# Altium footprint library Standard2.PcbLib: 423 footprints (part 9 of 27)
Each footprint in its own frame and in the unit in brackets; x right, y up, seen from the top. Pads: shape width x height; smd on the part's side, far side on the other; paste and mask are expansions set on the pad; w line width, h text height; cw(c..) or ccw(c..) is an arc to the next point about the centre after c.
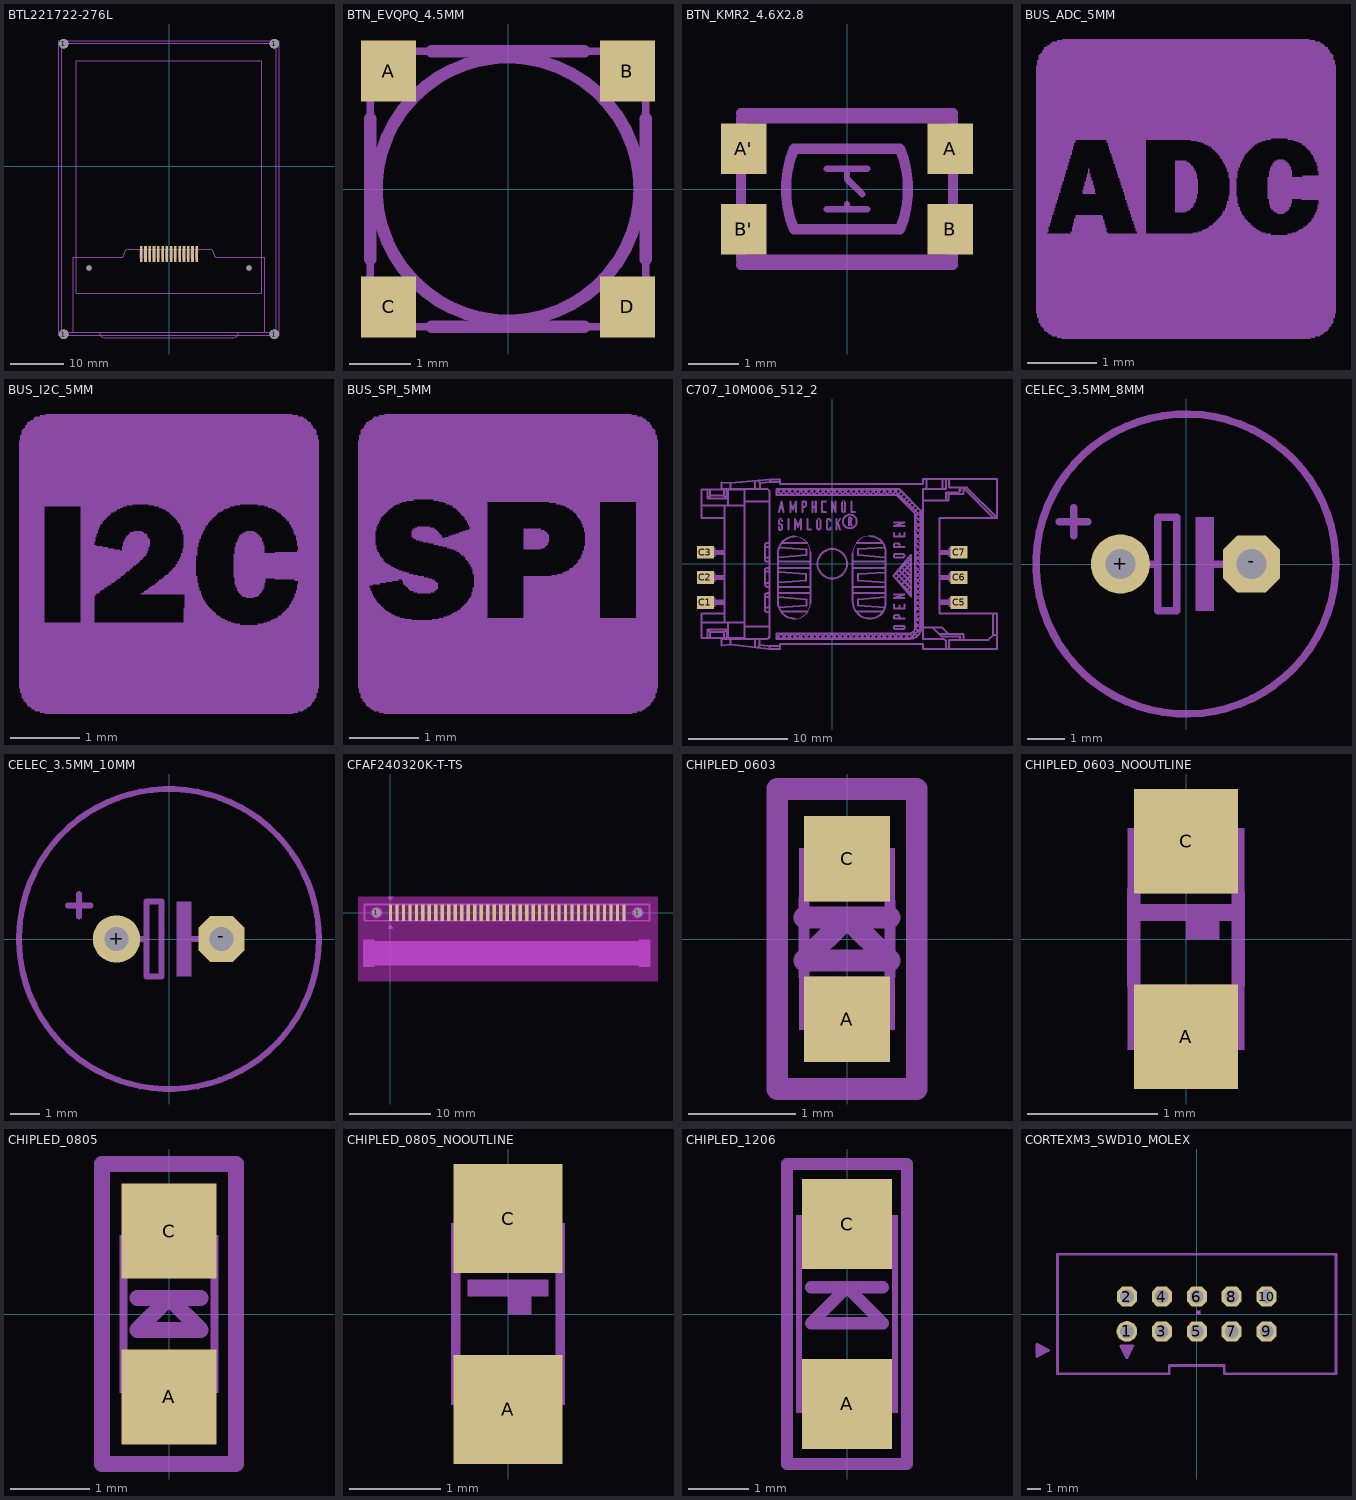
[diagram p8: the footprints below, top view; thin cyan lines are the x and y axes]

## BTL221722-276L [mm]
pads (20):
  round 1.8 hole 1.8: 1(-19.75,-31.5) 1(-19.75,23) 1(19.75,-31.5) 1(19.75,23)
  round 1 hole 1: 1(-15,-19.06) 1(15,-19.06)
  rect 0.5x3 smd: 1(-5.2,-16.44) 2(-4.4,-16.44) 3(-3.6,-16.44) 4(-2.8,-16.44) 5(-2,-16.44) 6(-1.2,-16.44) 7(-0.4,-16.44) 8(0.4,-16.44) 9(1.2,-16.44) 10(2,-16.44) 11(2.8,-16.44) 12(3.6,-16.44) 13(4.4,-16.44) 14(5.2,-16.44)
Mechanical 2:
  lines w0.203: -20.65,-31.66 -20.65,23.6 20.65,23.6 20.65,-31.66 -20.65,-31.66
Mechanical 18:
  drawing of 174 lines, arcs and shapes, not listed

## BTN_EVQPQ_4.5MM [mm]
pads (4):
  rect 0.9x1 smd: A(-1.95,1.925) B(1.95,1.925) C(-1.95,-1.925) D(1.95,-1.925)
Mechanical 2:
  lines w0.203: -2.25,-1.15 -2.25,1.15 ; -1.25,-2.25 1.25,-2.25 ; -1.25,2.25 1.25,2.25 ; 2.25,-1.15 2.25,1.15
Mechanical 18:
  circle w0.203: c0,0 r2.15
  lines w0.127: -2.25,-2.25 -2.25,2.25 2.25,2.25 2.25,-2.25 -2.25,-2.25

## BTN_KMR2_4.6X2.8 [mm]
pads (4):
  rect 0.9x1 smd: A(2.05,0.8) A'(-2.05,0.8) B(2.05,-0.8) B'(-2.05,-0.8)
Mechanical 2:
  lines w0.203: -2.1,-1.5 2.1,-1.5 ; -2.1,1.5 2.1,1.5
Mechanical 15:
  lines w0.127: -0.4,-0.4 0,-0.4 ; -0.4,0.4 0,0.4 ; 0,-0.3 0,-0.4 ; 0.3,-0.1 0,0.2 0,0.4 ; 0.4,-0.4 0,-0.4 ; 0.4,0.4 0,0.4
Mechanical 18:
  lines w0.203: -2.1,-1.4 2.1,-1.4 2.1,1.4 -2.1,1.4 -2.1,-1.4 ; -1.05,-0.8 cw(c0.882,0) -1.05,0.8 1.05,0.8 cw(c-0.882,0) 1.05,-0.8 -1.05,-0.8

## BUS_ADC_5MM [mm]
Mechanical 2:
  drawing of 615 lines, arcs and shapes, not listed

## BUS_I2C_5MM [mm]
Mechanical 2:
  drawing of 618 lines, arcs and shapes, not listed

## BUS_SPI_5MM [mm]
Mechanical 2:
  drawing of 603 lines, arcs and shapes, not listed

## C707_10M006_512_2 [mm]
pads (6):
  rect 1.7x1.3 smd: C1(-12.85,-3.915) C2(-12.85,-1.375) C3(-12.85,1.165) C5(12.85,-3.915) C6(12.85,-1.375) C7(12.85,1.165)
Mechanical 2:
  drawing of 461 lines, arcs and shapes, not listed
Mechanical 18:
  rectangle: -11.851,0.909 -10.906,1.418
  rectangle: -13.232,-1.854 -11.815,-0.872
  rectangle: -11.851,-1.636 -10.906,-1.127
  rectangle: -13.232,-4.399 -11.815,-3.417
  rectangle: -11.851,-4.181 -10.906,-3.635
  rectangle: 10.869,-4.181 11.815,-3.635
  rectangle: 11.778,-4.399 13.196,-3.417
  rectangle: 10.869,-1.636 11.815,-1.127
  rectangle: 11.778,-1.854 13.196,-0.872
  rectangle: 10.869,0.909 11.815,1.418
  rectangle: 11.778,0.691 13.196,1.636
  rectangle: -13.232,0.686 -11.815,1.668

## CELEC_3.5MM_8MM [mil]
pads (2):
  round 63 hole 32: +(-70,0)
  oct 61x61 hole 32: -(70,0)
Mechanical 2:
  circle w8: c0,0 r160
  lines w8: -135,45 -105,45 ; -120,30 -120,60
Mechanical 18:
  rectangle: 10,-50 30,50
  lines w8: -65,0 -30,0 ; 25,0 65,0 ; -30,0 -30,-50 -10,-50 -10,50 -30,50 -30,0

## CELEC_3.5MM_10MM [mil]
pads (2):
  round 63 hole 32: +(-70,0)
  oct 61x61 hole 32: -(70,0)
Mechanical 2:
  circle w8: c0,0 r200
  lines w8: -135,45 -105,45 ; -120,30 -120,60
Mechanical 18:
  rectangle: 10,-50 30,50
  lines w8: -65,0 -30,0 ; 25,0 65,0 ; -30,0 -30,-50 -10,-50 -10,50 -30,50 -30,0

## CFAF240320K-T-TS [mm]
pads (39):
  round 1 hole 1: 1(-1.725,0) 1(30.53,0)
  rect 0.4x2 smd: P$1(0,0) P$2(0.8,0) P$3(1.6,0) P$4(2.4,0) P$5(3.2,0) P$6(4,0) P$7(4.8,0) P$8(5.6,0) P$9(6.4,0) P$10(7.2,0) P$11(8,0) P$12(8.8,0) P$13(9.6,0) P$14(10.4,0) P$15(11.2,0) P$16(12,0) P$17(12.8,0) P$18(13.6,0) P$19(14.4,0) P$20(15.2,0) P$21(16,0) P$22(16.8,0) P$23(17.6,0) P$24(18.4,0) P$25(19.2,0) P$26(20,0) P$27(20.8,0) P$28(21.6,0) P$29(22.4,0) P$30(23.2,0) P$31(24,0) P$32(24.8,0) P$33(25.6,0) P$34(26.4,0) P$35(27.2,0) P$36(28,0) P$37(28.8,0)
Keep-Out Layer:
  rectangle: -4,-8.5 33,2
Mechanical 2:
  lines w0.203: -2,-6.6 -3.3,-6.6 -3.3,-3.4 -2,-3.4 ; -0.5,-1 -3.15,-1 -3.15,1 -0.5,1 ; 29.3,-1 31.95,-1 31.95,1 29.3,1 ; 30.7,-6.6 32,-6.6 32,-3.4 30.7,-3.4 ; -0.2,-1.9 0,-1.6 0.2,-1.9 -0.2,-1.9 ; -0.2,1.9 0.2,1.9 0,1.6 -0.2,1.9
Mechanical 18:
  circle w0.203: c-1.7,0 r0.6
  circle w0.203: c30.5,0 r0.6
  rectangle: -0.2,-1 0.2,1
  rectangle: 0.6,-1 1,1
  rectangle: 1.4,-1 1.8,1
  rectangle: 2.2,-1 2.6,1
  rectangle: 3,-1 3.4,1
  rectangle: 3.8,-1 4.2,1
  rectangle: 4.6,-1 5,1
  rectangle: 5.4,-1 5.8,1
  rectangle: 6.2,-1 6.6,1
  rectangle: 7,-1 7.4,1
  rectangle: 7.8,-1 8.2,1
  rectangle: 8.6,-1 9,1
  rectangle: 9.4,-1 9.8,1
  rectangle: 10.2,-1 10.6,1
  rectangle: 11,-1 11.4,1
  rectangle: 11.8,-1 12.2,1
  rectangle: 12.6,-1 13,1
  rectangle: 13.4,-1 13.8,1
  rectangle: 14.2,-1 14.6,1
  rectangle: 15,-1 15.4,1
  rectangle: 15.8,-1 16.2,1
  rectangle: 16.6,-1 17,1
  rectangle: 17.4,-1 17.8,1
  rectangle: 18.2,-1 18.6,1
  rectangle: 19,-1 19.4,1
  rectangle: 19.8,-1 20.2,1
  rectangle: 20.6,-1 21,1
  rectangle: 21.4,-1 21.8,1
  rectangle: 22.2,-1 22.6,1
  rectangle: 23,-1 23.4,1
  rectangle: 23.8,-1 24.2,1
  rectangle: 24.6,-1 25,1
  rectangle: 25.4,-1 25.8,1
  rectangle: 26.2,-1 26.6,1
  rectangle: 27,-1 27.4,1
  rectangle: 27.8,-1 28.2,1
  rectangle: 28.6,-1 29,1
  rectangle: -3.2,-6.5 31.9,-3.5
  lines w0.203: -3.2,-1 32,-1 32,1 -3.2,1 -3.2,-1 ; -0.2,-1.9 0,-1.6 0.2,-1.9 -0.2,-1.9

## CHIPLED_0603 [mil]
pads (2):
  rect 31.5x31.5 smd: A(0,-29.53) C(0,29.53)
Mechanical 2:
  lines w8: -15.75,7.87 0,7.87 ; 15.75,7.87 0,7.87 ; 0,7.87 -15.75,-7.87 15.75,-7.87 0,7.87 ; -25.59,-55.12 -25.59,55.12 25.59,55.12 25.59,-55.12 -25.59,-55.12
Mechanical 18:
  circle w2: c-13.78,24.61 r2.95
  rectangle: -17.72,27.56 -9.84,33.46
  rectangle: -10.83,21.65 -8.86,23.62
  rectangle: -17.72,13.78 -15.75,28.54
  rectangle: 9.84,21.65 17.72,33.46
  rectangle: -17.72,13.78 17.72,22.64
  rectangle: -17.72,-33.46 -9.84,-13.78
  rectangle: 9.84,-33.46 17.72,-13.78
  rectangle: -10.83,-22.64 10.83,-13.78
  rectangle: -10.83,-25.59 -6.89,-21.65
  rectangle: 6.89,-25.59 10.83,-21.65
  lines w2: -10.83,-32.48 cw(c0,-32.48) 10.83,-32.48
  lines w4: -15.75,-13.78 -15.75,14.76 ; -11.81,31.5 ccw(c0,32.53) 11.81,31.5 ; 15.75,-13.78 15.75,13.78

## CHIPLED_0603_NOOUTLINE [mil]
pads (2):
  rect 31.5x31.5 smd: A(0,-29.53) C(0,29.53)
Mechanical 2:
  rectangle: -15,5.5 15,10.5
  region: 0,0 10,0 10,10 0,10
Mechanical 18:
  circle w2: c-13.78,24.61 r2.95
  rectangle: -17.72,27.56 -9.84,33.46
  rectangle: -10.83,21.65 -8.86,23.62
  rectangle: -17.72,13.78 -15.75,28.54
  rectangle: 9.84,21.65 17.72,33.46
  rectangle: -17.72,13.78 17.72,22.64
  rectangle: -17.72,-33.46 -9.84,-13.78
  rectangle: 9.84,-33.46 17.72,-13.78
  rectangle: -10.83,-22.64 10.83,-13.78
  rectangle: -10.83,-25.59 -6.89,-21.65
  rectangle: 6.89,-25.59 10.83,-21.65
  lines w2: -10.83,-32.48 cw(c0,-32.48) 10.83,-32.48
  lines w4: -15.75,-13.78 -15.75,14.76 ; -11.81,31.5 ccw(c0,32.53) 11.81,31.5 ; 15.75,-13.78 15.75,13.78

## CHIPLED_0805 [mm]
pads (2):
  rect 1.2x1.2 smd: A(0,-1.05) C(0,1.05)
Mechanical 2:
  lines w0.203: -0.4,0.2 0,0.2 ; 0.4,0.2 0,0.2 ; 0,0.2 -0.4,-0.2 0.4,-0.2 0,0.2 ; -0.85,-1.9 0.85,-1.9 0.85,1.9 -0.85,1.9 -0.85,-1.9
Mechanical 18:
  circle w0.076: c-0.45,0.85 r0.103
  rectangle: 0.3,0.5 0.625,1
  rectangle: -0.325,0.5 -0.175,0.75
  rectangle: 0.175,0.5 0.325,0.75
  rectangle: -0.2,0.5 0.2,0.675
  rectangle: 0.3,-1 0.625,-0.5
  rectangle: -0.625,-1 -0.3,-0.5
  rectangle: 0.175,-0.75 0.325,-0.5
  rectangle: -0.325,-0.75 -0.175,-0.5
  rectangle: -0.2,-0.675 0.2,-0.5
  rectangle: -0.6,0.5 -0.3,0.762
  rectangle: -0.625,0.925 -0.3,1
  lines w0.102: -0.575,-0.5 -0.575,0.925 ; -0.35,-0.925 cw(c0,-0.979) 0.35,-0.925 ; -0.35,0.925 ccw(c0,0.979) 0.35,0.925 ; 0.575,-0.525 0.575,0.525

## CHIPLED_0805_NOOUTLINE [mm]
pads (2):
  rect 1.2x1.2 smd: A(0,-1.05) C(0,1.05)
Mechanical 2:
  rectangle: -0.445,0.191 0.445,0.381
  region: 0,0 0.254,0 0.254,0.254 0,0.254
Mechanical 18:
  circle w0.076: c-0.45,0.85 r0.103
  rectangle: -0.625,0.925 -0.3,1
  rectangle: -0.6,0.5 -0.3,0.762
  rectangle: -0.2,-0.675 0.2,-0.5
  rectangle: -0.325,-0.75 -0.175,-0.5
  rectangle: 0.175,-0.75 0.325,-0.5
  rectangle: -0.625,-1 -0.3,-0.5
  rectangle: 0.3,-1 0.625,-0.5
  rectangle: -0.2,0.5 0.2,0.675
  rectangle: 0.175,0.5 0.325,0.75
  rectangle: -0.325,0.5 -0.175,0.75
  rectangle: 0.3,0.5 0.625,1
  lines w0.102: -0.575,-0.5 -0.575,0.925 ; -0.35,-0.925 cw(c0,-0.979) 0.35,-0.925 ; -0.35,0.925 ccw(c0,0.979) 0.35,0.925 ; 0.575,-0.525 0.575,0.525

## CHIPLED_1206 [mm]
pads (2):
  rect 1.5x1.5 smd: A(0,-1.496) C(0,1.496)
Mechanical 2:
  lines w0.203: -0.6,0.446 0,0.446 ; 0.6,0.446 0,0.446 ; 0,0.446 -0.6,-0.154 0.6,-0.154 0,0.446 ; -1,-2.499 -1,2.499 1,2.499 1,-2.499 -1,-2.499
Mechanical 18:
  circle w0.076: c-0.55,1.425 r0.1
  rectangle: -0.85,1.525 -0.35,1.65
  rectangle: -0.85,1.225 -0.625,1.55
  rectangle: -0.45,1.225 -0.325,1.45
  rectangle: -0.65,1.225 -0.225,1.35
  rectangle: 0.35,1.3 0.85,1.65
  rectangle: 0.25,1.225 0.85,1.35
  rectangle: -0.85,0.95 0.85,1.25
  rectangle: -0.85,-1.65 0.85,-0.95
  lines w0.102: -0.8,-0.95 -0.8,0.95 ; -0.4,1.6 ccw(c0,1.626) 0.4,1.6 ; 0.8,-0.95 0.8,0.95

## CORTEXM3_SWD10_MOLEX [mm]
pads (10):
  round 1.5 hole 1: 1(-5.08,-1.27)
  oct 1.452x1.452 hole 1: 2(-5.08,1.27) 3(-2.54,-1.27) 4(-2.54,1.27) 5(0,-1.27) 6(0,1.27) 7(2.54,-1.27) 8(2.54,1.27) 9(5.08,-1.27) 10(5.08,1.27)
Mechanical 2:
  region: -11.185,-2.905 -11.185,-2.397 -11.439,-2.397 -11.439,-2.905
  region: -11.439,-3.032 -11.439,-2.651 -11.566,-2.651 -11.566,-3.032
  region: -11.439,-2.651 -11.439,-2.27 -11.566,-2.27 -11.566,-2.651
  region: -10.982,-2.778 -10.982,-2.524 -11.236,-2.524 -11.236,-2.778
  lines w0.203: -11.033,-2.651 -10.779,-2.651 ; -10.779,-2.651 -11.617,-2.219 -11.617,-3.083 -10.779,-2.651 ; -10.125,-4.35 -10.125,4.35 10.125,4.35 10.125,-4.35 2,-4.35 2,-3.75 -2,-3.75 -2,-4.35 -10.125,-4.35
Mechanical 10 keep-out:
  region: 0,0 0.254,0 0.254,0.254 0,0.254
  region: 0,0 0.254,0 0.254,0.254 0,0.254
  region: 0,0 0.254,0 0.254,0.254 0,0.254
  region: 0,0 0.254,0 0.254,0.254 0,0.254
  region: 0,0 0.254,0 0.254,0.254 0,0.254
  region: 0,0 0.254,0 0.254,0.254 0,0.254
  region: 0,0 0.254,0 0.254,0.254 0,0.254
  region: 0,0 0.254,0 0.254,0.254 0,0.254
  region: 0,0 0.254,0 0.254,0.254 0,0.254
  region: 0,0 0.254,0 0.254,0.254 0,0.254
  region: 0,0 0.254,0 0.254,0.254 0,0.254
  region: 0,0 0.254,0 0.254,0.254 0,0.254
Mechanical 11 keep-out:
  region: 0,0 0.254,0 0.254,0.254 0,0.254
  region: 0,0 0.254,0 0.254,0.254 0,0.254
  region: 0,0 0.254,0 0.254,0.254 0,0.254
  region: 0,0 0.254,0 0.254,0.254 0,0.254
  region: 0,0 0.254,0 0.254,0.254 0,0.254
  region: 0,0 0.254,0 0.254,0.254 0,0.254
  region: 0,0 0.254,0 0.254,0.254 0,0.254
  region: 0,0 0.254,0 0.254,0.254 0,0.254
  region: 0,0 0.254,0 0.254,0.254 0,0.254
  region: 0,0 0.254,0 0.254,0.254 0,0.254
  region: 0,0 0.254,0 0.254,0.254 0,0.254
  region: 0,0 0.254,0 0.254,0.254 0,0.254
Mechanical 18:
  rectangle: -5.334,-2.769 -4.826,-2.515
  rectangle: -5.461,-2.515 -5.08,-2.388
  rectangle: -5.08,-2.515 -4.699,-2.388
  rectangle: -5.207,-2.972 -4.953,-2.718
  lines w0.203: -5.08,-2.921 -5.08,-3.175 ; -5.08,-3.175 -4.648,-2.337 -5.512,-2.337 -5.08,-3.175